# Altium integrated library Cap-Tant-SMD_V2.IntLib: 147 symbols (continued)
## 33uF_20V_TAJY_10%
designator C?  value 33uF  Voltage: 20V  Text1: TAJY  (hidden comment: 33uF_20V_TAJY_10%)
Cap Tantalum Case-Y; Manufacturer: AVX; Part Number: TAJY336K020RNJ; Tol: 10%; Reutech PN: 5910-TN-; Package: TAJ-Y; EDM-PN: *; Text2: *; SAAB PN: *; DCE Part No: *
footprint TAJ-Y (TAJ-Y 7.3x4.3mm)
pins: 1, 2

## 33uF_25V_595D-C_20%
designator C?  value 33uF  Voltage: 25V  Text1: 595D-C  (hidden comment: 33uF_25V_595D-C_20%)
Cap Tantalum Case-C; Manufacturer: Vishay; Part Number: 595D336X0025C2T; Tol: 20%; Reutech PN: 5910-TN-; Package: T595D-C; EDM-PN: *; Text2: *; SAAB PN: *; DCE Part No: *
footprint T595D-C (Tant Capacitor, 2-Leads, Body 6.0x3.2mm, IPC Medium Density)
pins: 1, 2

## 33uF_25V_595D-C_20%-DNF
designator C?, comment value (33uF)  Voltage: 25V  Text1: 595D-C  (hidden comment: 33uF_25V_595D-C_20%)
Cap Tantalum Case-C - Do not Fit; Manufacturer: Vishay; Part Number: DNF - 595D336X0025C2T; Tol: 20%; Reutech PN: 5910-TN-; Package: T595D-C; EDM-PN: *; Text2: *; SAAB PN: *; DCE Part No: *
footprint T595D-C (Tant Capacitor, 2-Leads, Body 6.0x3.2mm, IPC Medium Density)
pins: 1, 2

## 33uF_25V_CASE-D_20%
designator C?, comment value 33uF  Voltage: 25V  Text1: CASE-D  (hidden comment: 33uF_25V_T491D_20%)
Cap Tantalum Case-D; Manufacturer: Various; Tol: 20%; Reutech PN: 5910-TN-; Part Number: 33uF_25V_T491D_20%; Package: T491-D; EDM-PN: *; Text2: *; SAAB PN: *; DCE Part No: *
footprint T491-D (Tant Capacitor, 2-Leads, Body 7.3x4.3mm, IPC Medium Density)
pins: 1, 2

## 33uF_25V_T491-C_10%
designator C?  value 33uF  Voltage: 25V  Text1: T491-C  (hidden comment: 33uF_25V_T491-C_10%)
Cap Tantalum Case-C; Manufacturer: Kemet; Part Number: T491C336K025AT; Tol: 10%; Reutech PN: 5910-TN-; Package: T491-C; EDM-PN: *; Text2: *; SAAB PN: *; DCE Part No: *
footprint T491-C (Tant Capacitor, 2-Leads, Body 6.0x3.2mm, IPC Medium Density)
pins: 1, 2

## 33uF_25V_TAJY_10%
designator C?  value 33uF  Voltage: 25V  Text1: TAJY  (hidden comment: 33uF_25V_TAJY_10%)
Cap Tantalum Case-Y; Manufacturer: AVX; Part Number: TAJY336K025RNJ; Tol: 10%; Reutech PN: 5910-TN-; Package: TAJ-Y; EDM-PN: *; Text2: *; SAAB PN: *; DCE Part No: *
footprint TAJ-Y (TAJ-Y 7.3x4.3mm)
pins: 1, 2

## 33uF_25V_WCAP-PHGP_20%-875015519004
designator C?, comment value 33uF  Voltage: 25V  Text1: PHGP  (hidden comment: 875015519004)
Cap Aluminum Polymer; Manufacturer: Wurth; Tol: 20%; Reutech PN: 5910-TN-; Part Number: 875015519004; Package: WCAP-PHGP-7.3x4.3-1.9; EDM-PN: *; Text2: *; SAAB PN: *; DCE Part No: *
footprint WCAP-PHGP-7.3x4.3-1.9 (Aluminum Polymer 7.3x4.3mm)
pins: 1, 2

## 33uF_35V_CASE-D_10%
designator C?, comment value 33uF  Voltage: 35V  Text1: CASE-D  (hidden comment: 33uF_35V_T491D_10%)
Cap Tantalum Case-D; Manufacturer: Various; Tol: 10%; Reutech PN: 5910-TN-; Part Number: 33uF_35V_T491D_10%; Package: T491-D; EDM-PN: *; Text2: *; SAAB PN: *; DCE Part No: *
footprint T491-D (Tant Capacitor, 2-Leads, Body 7.3x4.3mm, IPC Medium Density)
pins: 1, 2

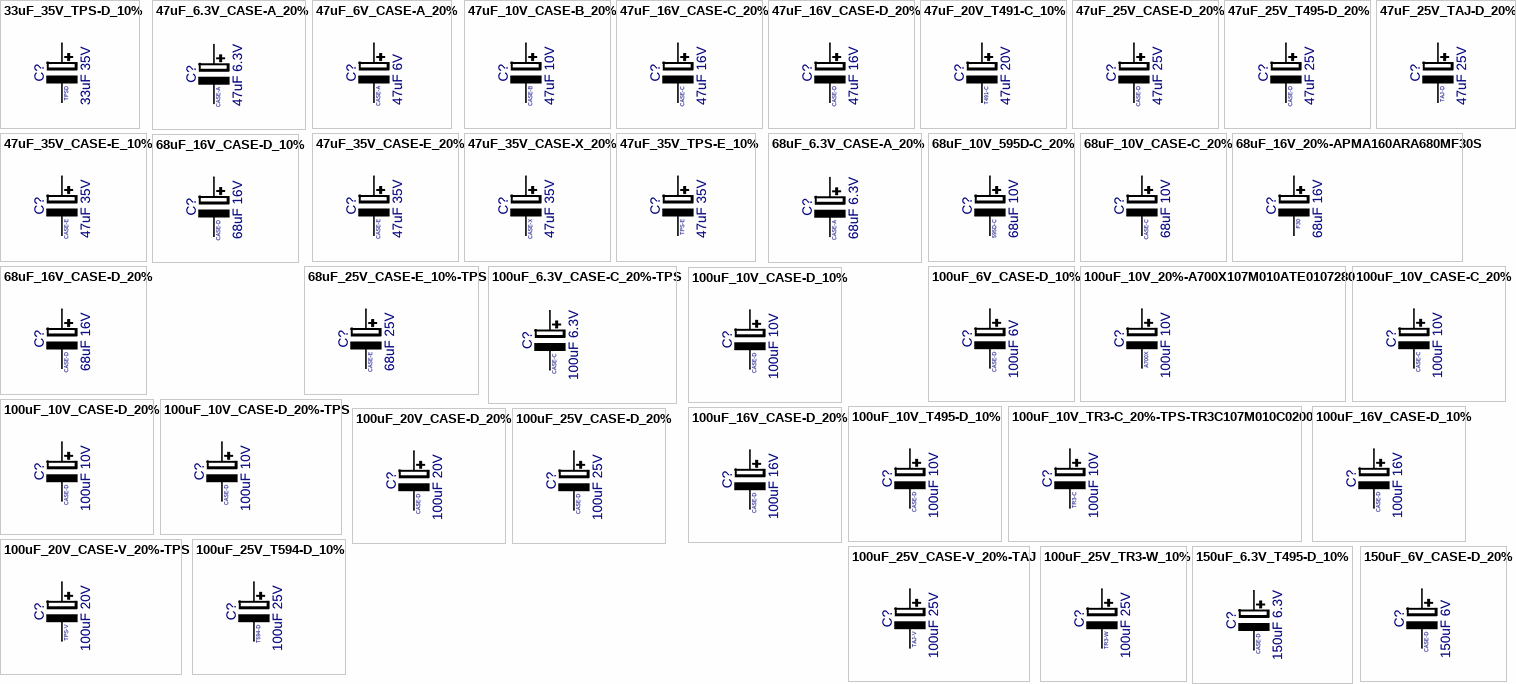
[diagram p2: symbols 33uF_35V_TPS-D_10% to 150uF_6V_CASE-D_20%]

## 33uF_35V_TPS-D_10%
designator C?, comment value 33uF  Voltage: 35V  Text1: TPSD  (hidden comment: 33uF_35V_TPSD_10%)
Cap Tantalum Case-D Low ESR; Manufacturer: AVX; Part Number: TPSD336K035R0300; Tol: 10%; Reutech PN: 5910-TN-; Package: TPS-D; EDM-PN: *; Text2: *; SAAB PN: *; DCE Part No: *
footprint T491-D (Tant Capacitor, 2-Leads, Body 7.3x4.3mm, IPC Medium Density)
pins: 1, 2

## 47uF_6.3V_CASE-A_20%
designator C?, comment value 47uF  Voltage: 6.3V  Text1: CASE-A  (hidden comment: 47uF_6.3V_T491A_20%)
Cap Tantalum Case-A; Manufacturer: Various; Tol: 20%; Reutech PN: 5910-TN-; Part Number: 47uF_6.3V_T491A_20%; Package: T491-A; EDM-PN: *; Text2: *; SAAB PN: *; DCE Part No: *
footprint T491-A (Tant Capacitor, 2-Leads, Body 3.2x1.6mm, IPC Medium Density)
pins: 1, 2

## 47uF_6V_CASE-A_20%
designator C?, comment value 47uF  Voltage: 6V  Text1: CASE-A  (hidden comment: 47uF_6V_T491A_20%)
Cap Tantalum Case-A; Manufacturer: Various; Tol: 20%; Reutech PN: 5910-TN-; Part Number: 47uF_6V_T491A_20%; Package: T491-A; EDM-PN: *; Text2: *; SAAB PN: *; DCE Part No: *
footprint T491-A (Tant Capacitor, 2-Leads, Body 3.2x1.6mm, IPC Medium Density)
pins: 1, 2

## 47uF_10V_CASE-B_20%
designator C?, comment value 47uF  Voltage: 10V  Text1: CASE-B  (hidden comment: 47uF_10V_T491B_20%)
Cap Tantalum Case-B; Manufacturer: Various; Tol: 20%; Reutech PN: 5910-TN-; Part Number: 47uF_10V_T491B_20%; Package: T491-B; EDM-PN: *; Text2: *; SAAB PN: *; DCE Part No: *
footprint T491-B (Tant Capacitor, 2-Leads, Body 3.5x2.8mm, IPC Medium Density)
pins: 1, 2

## 47uF_16V_CASE-C_20%
designator C?, comment value 47uF  Voltage: 16V  Text1: CASE-C  (hidden comment: 47uF_16V_T491C_20%)
Cap Tantalum Case-C; Manufacturer: Various; DCE Part No: 10305; Tol: 20%; Reutech PN: 5910-TN-*; Part Number: 47uF_16V_T491C_20%; Package: T491-C; EDM-PN: *; Text2: *; SAAB PN: *
footprint T491-C (Tant Capacitor, 2-Leads, Body 6.0x3.2mm, IPC Medium Density)
pins: 1, 2

## 47uF_16V_CASE-D_20%
designator C?, comment value 47uF  Voltage: 16V  Text1: CASE-D  (hidden comment: 47uF_16V_T491D_20%)
Cap Tantalum Case-D; Manufacturer: Various; Tol: 20%; Reutech PN: 5910-TN-; Part Number: 47uF_16V_T491D_20%; Package: T491-D; EDM-PN: *; Text2: *; SAAB PN: *; DCE Part No: *
footprint T491-D (Tant Capacitor, 2-Leads, Body 7.3x4.3mm, IPC Medium Density)
pins: 1, 2

## 47uF_20V_T491-C_10%
designator C?  value 47uF  Voltage: 20V  Text1: T491-C  (hidden comment: 47uF_20V_T491-C_10%)
Cap Tantalum Case-C; Manufacturer: Kemet; Part Number: T491C476K020AT; Tol: 10%; Reutech PN: 5910-TN-; Package: T491-C; EDM-PN: *; Text2: *; SAAB PN: *; DCE Part No: *
footprint T491-C (Tant Capacitor, 2-Leads, Body 6.0x3.2mm, IPC Medium Density)
pins: 1, 2

## 47uF_25V_CASE-D_20%
designator C?, comment value 47uF  Voltage: 25V  Text1: CASE-D  (hidden comment: 47uF_25V_T491D_20%)
Cap Tantalum Case-D; Manufacturer: Various; Tol: 20%; Reutech PN: 5910-TN-; Part Number: 47uF_25V_T491D_20%; Package: T491-D; EDM-PN: *; Text2: *; SAAB PN: *; DCE Part No: *
footprint T491-D (Tant Capacitor, 2-Leads, Body 7.3x4.3mm, IPC Medium Density)
pins: 1, 2

## 47uF_25V_T495-D_20%
designator C?  value 47uF  Voltage: 25V  Text1: CASE-D  (hidden comment: 47uF_25V_T495-D_20%)
Cap Tantalum T495 Low ESR; Manufacturer: Kemet; Part Number: T495D476M025ATE200; Tol: 20%; Reutech PN: 5910-TN-; Package: T491-D; EDM-PN: *; Text2: *; SAAB PN: *; DCE Part No: *
footprint T491-D (Tant Capacitor, 2-Leads, Body 7.3x4.3mm, IPC Medium Density)
pins: 1, 2

## 47uF_25V_TAJ-D_20%
designator C?, comment value 47uF  Voltage: 25V  Text1: TAJ-D  (hidden comment: 47uF_25V_TAJD_20%)
Cap Tantalum TAJ-D; Manufacturer: AVX; Tol: 20%; Reutech PN: 5910-TN-; Part Number: 47uF_25V_TAJD_20%; Package: T491-D; EDM-PN: *; Text2: *; SAAB PN: *; DCE Part No: *
footprint T491-D (Tant Capacitor, 2-Leads, Body 7.3x4.3mm, IPC Medium Density)
pins: 1, 2

## 47uF_35V_CASE-E_10%
designator C?, comment value 47uF  Voltage: 35V  Text1: CASE-E  (hidden comment: 47uF_35V_T491E_10%)
Cap Tantalum Case-E; Manufacturer: Various; Tol: 10%; Reutech PN: 5910-TN-; Part Number: 47uF_35V_T491E_10%; Package: T491-E; EDM-PN: *; Text2: *; SAAB PN: *; DCE Part No: *
footprint T491-E (Tant Capacitor, 2-Leads, Body 7.3x6.0mm, IPC Medium Density)
pins: 1, 2

## 47uF_35V_CASE-E_20%
designator C?, comment value 47uF  Voltage: 35V  Text1: CASE-E  (hidden comment: 47uF_35V_T491E_20%)
Cap Tantalum Case-E; Manufacturer: Various; Tol: 20%; Reutech PN: 5910-TN-; Part Number: 47uF_35V_T491E_20%; Package: T491-E; EDM-PN: *; Text2: *; SAAB PN: *; DCE Part No: *
footprint T491-E (Tant Capacitor, 2-Leads, Body 7.3x6.0mm, IPC Medium Density)
pins: 1, 2

## 47uF_35V_CASE-X_20%
designator C?, comment value 47uF  Voltage: 35V  Text1: CASE-X  (hidden comment: 47uF_35V_T491X_20%)
Cap Tantalum Case-X; Manufacturer: Various; Tol: 20%; Reutech PN: 5910-TN-; Part Number: 47uF_35V_T491X_20%; Package: T491-X; EDM-PN: *; Text2: *; SAAB PN: *; DCE Part No: *
footprint T491-X (Tant Capacitor, 2-Leads, Body 7.3x4.3mm, IPC Medium Density)
pins: 1, 2

## 47uF_35V_TPS-E_10%
designator C?  value 47uF  Voltage: 35V  Text1: TPS-E  (hidden comment: 47uF_35V_TPS-E_10%)
Cap Tantalum Case-E; Manufacturer: AVX; Part Number: TPSE476K035R0200; Tol: 10%; Reutech PN: 5910-TN-; Package: TPS-E; EDM-PN: *; Text2: *; SAAB PN: *; DCE Part No: *
footprint TPS-E (Tant Capacitor, 2-Leads, Body 7.3x4.3mm, IPC Medium Density)
pins: 1, 2

## 68uF_6.3V_CASE-A_20%
designator C?, comment value 68uF  Voltage: 6.3V  Text1: CASE-A  (hidden comment: 68uF_6.3V_T491A_20%)
Cap Tantalum Case-A; Manufacturer: Various; Tol: 20%; Reutech PN: 5910-TN-; Part Number: 68uF_6.3V_T491A_20%; Package: T491-A; EDM-PN: *; Text2: *; SAAB PN: *; DCE Part No: *
footprint T491-A (Tant Capacitor, 2-Leads, Body 3.2x1.6mm, IPC Medium Density)
pins: 1, 2

## 68uF_10V_595D-C_20%
designator C?  value 68uF  Voltage: 10V  Text1: 595D-C  (hidden comment: 68uF_10V_595D-C_20%)
Cap Tantalum Case-C; Manufacturer: Vishay; Part Number: 595D686X0010C2T; Tol: 20%; Reutech PN: 5910-TN-; Package: T595D-C; EDM-PN: *; Text2: *; SAAB PN: *; DCE Part No: *
footprint T595D-C (Tant Capacitor, 2-Leads, Body 6.0x3.2mm, IPC Medium Density)
pins: 1, 2

## 68uF_10V_CASE-C_20%
designator C?, comment value 68uF  Voltage: 10V  Text1: CASE-C  (hidden comment: 68uF_10V_T491C_20%)
Cap Tantalum Case-C; Manufacturer: Various; Tol: 20%; Reutech PN: 5910-TN-; Part Number: 68uF_10V_T491C_20%; Package: T491-C; EDM-PN: *; Text2: *; SAAB PN: *; DCE Part No: *
footprint T491-C (Tant Capacitor, 2-Leads, Body 6.0x3.2mm, IPC Medium Density)
pins: 1, 2

## 68uF_16V_20%-APMA160ARA680MF30S
designator C?, comment value 68uF  Voltage: 16V  Text1: F30  (hidden comment: APMA160ARA680MF30S)
Cap Aluminum Polymer; Manufacturer: United Chemi-Con; Tol: 20%; Reutech PN: 5910-TN-; Part Number: APMA160ARA680MF30S; Package: CAP-EL-SMD-MPS-F30; EDM-PN: *; Text2: *; SAAB PN: *; DCE Part No: *
footprint CAP-EL-SMD-MPS-F30 (CAP El SMD 6.3x7.7mm)
pins: 1, 2

## 68uF_16V_CASE-D_10%
designator C?, comment value 68uF  Voltage: 16V  Text1: CASE-D  (hidden comment: 68uF_16V_T491D_10%)
Cap Tantalum Case-D; Manufacturer: Various; Tol: 10%; Reutech PN: 5910-TN-; Part Number: 68uF_16V_T491D_10%; Package: T491-D; EDM-PN: *; Text2: *; SAAB PN: *; DCE Part No: *
footprint T491-D (Tant Capacitor, 2-Leads, Body 7.3x4.3mm, IPC Medium Density)
pins: 1, 2

## 68uF_16V_CASE-D_20%
designator C?, comment value 68uF  Voltage: 16V  Text1: CASE-D  (hidden comment: 68uF_16V_T491D_20%)
Cap Tantalum Case-D; Manufacturer: Various; Tol: 20%; Reutech PN: 5910-TN-; Part Number: 68uF_16V_T491D_20%; Package: T491-D; EDM-PN: *; Text2: *; SAAB PN: *; DCE Part No: *
footprint T491-D (Tant Capacitor, 2-Leads, Body 7.3x4.3mm, IPC Medium Density)
pins: 1, 2

## 68uF_25V_CASE-E_10%-TPS
designator C?  value 68uF  Voltage: 25V  Text1: CASE-E  (hidden comment: 68uF_25V_CASE-E_10%-TPS)
Cap Tantalum TPS Low ESR; Manufacturer: AVX; Part Number: TPSE686K025R0125; Tol: 10%; Reutech PN: 5910-TN-; Package: T491-E; EDM-PN: *; Text2: *; SAAB PN: *; DCE Part No: *
footprint T491-E (Tant Capacitor, 2-Leads, Body 7.3x6.0mm, IPC Medium Density)
pins: 1, 2

## 100uF_6.3V_CASE-C_20%-TPS
designator C?  value 100uF  Voltage: 6.3V  Text1: CASE-C  (hidden comment: 100uF_6.3V_CASE-C_20%-TPS)
Cap Tantalum TPS Low ESR; Manufacturer: AVX; Part Number: TPSC107M006#0075; Tol: 20%; Reutech PN: 5910-TN-; Package: T491-C; EDM-PN: *; Text2: *; SAAB PN: *; DCE Part No: *
footprint T491-C (Tant Capacitor, 2-Leads, Body 6.0x3.2mm, IPC Medium Density)
pins: 1, 2

## 100uF_6V_CASE-D_10%
designator C?  value 100uF  Voltage: 6V  Text1: CASE-D  (hidden comment: 100uF_6V_CASE-D_10%)
Cap Tantalum Case-D; Manufacturer: Various; Part Number: 100uF_6V_T491D_10%; Tol: 10%; Reutech PN: 5910-TN-; Package: T491-D; EDM-PN: *; Text2: *; SAAB PN: *; DCE Part No: *
footprint T491-D (Tant Capacitor, 2-Leads, Body 7.3x4.3mm, IPC Medium Density)
pins: 1, 2

## 100uF_10V_20%-A700X107M010ATE0107280
designator C?, comment value 100uF  Voltage: 10V  Text1: A700X  (hidden comment: A700X107M010ATE0107280)
Cap Aluminium Organic Polymer A700X Low ESR; Manufacturer: Kemet; Tol: 20%; Part Number: A700X107M010ATE0107280; Package: TANT-A700X; EDM-PN: *; Text2: *; Reutech PN: *; SAAB PN: *; DCE Part No: *
footprint TANT-A700X (A700X 7.3x4.3mm)
pins: 1, 2

## 100uF_10V_CASE-C_20%
designator C?, comment value 100uF  Voltage: 10V  Text1: CASE-C  (hidden comment: 100uF_10V_T491C_20%)
Cap Tantalum Case-C; Manufacturer: Various; Tol: 20%; Reutech PN: 5910-TN-; Part Number: 100uF_10V_T491C_20%; Package: T491-C; EDM-PN: *; Text2: *; SAAB PN: *; DCE Part No: *
footprint T491-C (Tant Capacitor, 2-Leads, Body 6.0x3.2mm, IPC Medium Density)
pins: 1, 2

## 100uF_10V_CASE-D_10%
designator C?  value 100uF  Voltage: 10V  Text1: CASE-D  (hidden comment: 100uF_10V_CASE-D_10%)
Cap Tantalum Case-D; Manufacturer: Various; Part Number: 100uF_10V_T491D_10%; Tol: 10%; Reutech PN: 5910-TN-0078; Package: T491-D; EDM-PN: *; Text2: *; SAAB PN: *; DCE Part No: *
footprint T491-D (Tant Capacitor, 2-Leads, Body 7.3x4.3mm, IPC Medium Density)
pins: 1, 2

## 100uF_10V_CASE-D_20%
designator C?  value 100uF  Voltage: 10V  Text1: CASE-D  (hidden comment: 100uF_10V_CASE-D_20%)
Cap Tantalum Case-D; Manufacturer: Various; Part Number: 100uF_10V_T491D_20%; Tol: 20%; Reutech PN: 5910-TN-; Package: T491-D; EDM-PN: *; Text2: *; SAAB PN: *; DCE Part No: *
footprint T491-D (Tant Capacitor, 2-Leads, Body 7.3x4.3mm, IPC Medium Density)
pins: 1, 2

## 100uF_10V_CASE-D_20%-TPS
designator C?  value 100uF  Voltage: 10V  Text1: CASE-D  (hidden comment: 100uF_10V_CASE-D_20%-TPS)
Cap Tantalum TPS Low ESR; Manufacturer: AVX; Part Number: TPSD107M010#0050; Tol: 20%; Reutech PN: 5910-TN-; Package: T491-D; EDM-PN: *; Text2: *; SAAB PN: *; DCE Part No: *
footprint T491-D (Tant Capacitor, 2-Leads, Body 7.3x4.3mm, IPC Medium Density)
pins: 1, 2

## 100uF_10V_T495-D_10%
designator C?  value 100uF  Voltage: 10V  Text1: CASE-D  (hidden comment: 100uF_10V_T495-D_10%)
Cap Tantalum T495 Low ESR; Manufacturer: Kemet; Part Number: T495D107K010ATE100; Tol: 10%; Reutech PN: 5910-TN-0192; Package: T491-D; EDM-PN: *; Text2: *; SAAB PN: *; DCE Part No: *
footprint T491-D (Tant Capacitor, 2-Leads, Body 7.3x4.3mm, IPC Medium Density)
pins: 1, 2

## 100uF_10V_TR3-C_20%-TPS-TR3C107M010C0200
designator C?, comment value 100uF  Voltage: 10V  Text1: TR3-C  (hidden comment: TR3C107M010C0200)
Cap Tantalum TP3 Low ESR; Manufacturer: Vishay; Tol: 20%; Part Number: TR3C107M010C0200; Package: TR3-C; EDM-PN: *; Text2: *; Reutech PN: *; SAAB PN: *; DCE Part No: *
footprint TR3-C (Tant Capacitor, 2-Leads, Body 6.0x3.2mm, IPC Medium Density)
pins: 1, 2

## 100uF_16V_CASE-D_10%
designator C?  value 100uF  Voltage: 16V  Text1: CASE-D  (hidden comment: 100uF_16V_CASE-D_10%)
Cap Tantalum Case-D; Manufacturer: Various; Part Number: 100uF_16V_T491D_10%; Tol: 10%; Reutech PN: 5910-TN-0195; Package: T491-D; EDM-PN: *; Text2: *; SAAB PN: *; DCE Part No: *
footprint T491-D (Tant Capacitor, 2-Leads, Body 7.3x4.3mm, IPC Medium Density)
pins: 1, 2

## 100uF_16V_CASE-D_20%
designator C?  value 100uF  Voltage: 16V  Text1: CASE-D  (hidden comment: 100uF_16V_CASE-D_20%)
Cap Tantalum Case-D; Manufacturer: Various; Part Number: 100uF_16V_T491D_20%; Tol: 20%; Reutech PN: 5910-TN-; Package: T491-D; EDM-PN: *; Text2: *; SAAB PN: *; DCE Part No: *
footprint T491-D (Tant Capacitor, 2-Leads, Body 7.3x4.3mm, IPC Medium Density)
pins: 1, 2

## 100uF_20V_CASE-D_20%
designator C?  value 100uF  Voltage: 20V  Text1: CASE-D  (hidden comment: 100uF_20V_CASE-D_20%)
Cap Tantalum Case-D; Manufacturer: Various; Part Number: 100uF_20V_T491D_20%; Tol: 20%; Reutech PN: 5910-TN-; Package: T491-D; EDM-PN: *; Text2: *; SAAB PN: *; DCE Part No: *
footprint T491-D (Tant Capacitor, 2-Leads, Body 7.3x4.3mm, IPC Medium Density)
pins: 1, 2

## 100uF_20V_CASE-V_20%-TPS
designator C?, comment value 100uF  Voltage: 20V  Text1: TPS-V  (hidden comment: 100uF_20V_CASE-V_20%)
Cap Tantalum Case-V; Manufacturer: AVX; Part Number: TPSV107K020R0060; Tol: 20%; Reutech PN: 5910-TN-; Package: TPS-V; EDM-PN: *; Text2: *; SAAB PN: *; DCE Part No: *
footprint TPS-V (Tant Capacitor, 2-Leads, Body 7.3x6.1mm, IPC Medium Density)
pins: 1, 2

## 100uF_25V_CASE-D_20%
designator C?  value 100uF  Voltage: 25V  Text1: CASE-D  (hidden comment: 100uF_25V_CASE-D_20%)
Cap Tantalum Case-D; Manufacturer: Various; Part Number: 100uF_25V_T491D_20%; Tol: 20%; Reutech PN: 5910-TN-; Package: T491-D; EDM-PN: *; Text2: *; SAAB PN: *; DCE Part No: *
footprint T491-D (Tant Capacitor, 2-Leads, Body 7.3x4.3mm, IPC Medium Density)
pins: 1, 2

## 100uF_25V_CASE-V_20%-TAJ
designator C?, comment value 100uF  Voltage: 25V  Text1: TAJ-V  (hidden comment: TAJV107K025RNJ)
Cap Tantalum Case-V; Manufacturer: AVX; Tol: 20%; Reutech PN: 5910-TN-; Part Number: TAJV107K025RNJ; Package: TAJ-V; EDM-PN: *; Text2: *; SAAB PN: *; DCE Part No: *
footprint TAJ-V (TAJ-V 7.3x6.1mm, IPC Medium Density)
pins: 1, 2

## 100uF_25V_T594-D_10%
designator C?  value 100uF  Voltage: 25V  Text1: T594-D  (hidden comment: 100uF_25V_T594-D_10%)
Cap Tantalum T594 Low ESR; Manufacturer: Kemet; Part Number: 594D107X9025R2T; Tol: 10%; Reutech PN: 5910-TN-; Package: T594-D; EDM-PN: *; Text2: *; SAAB PN: *; DCE Part No: *
footprint T594-D (Tant Capacitor, 2-Leads, Body 7.3x4.3mm, IPC Medium Density)
pins: 1, 2

## 100uF_25V_TR3-W_10%
designator C?  value 100uF  Voltage: 25V  Text1: TR3-W  (hidden comment: 100uF_25V_TR3-W_10%)
Cap Tantalum Case-W Low ESR; Manufacturer: Vishay; Part Number: TR3A336K6R3C0600; Tol: 10%; Reutech PN: 5910-TN-; Package: TR3-W; EDM-PN: *; Text2: *; SAAB PN: *; DCE Part No: *
footprint TR3-W (TR3 W 2-Leads, Body 3.2x1.6mm)
pins: 1, 2

## 150uF_6.3V_T495-D_10%
designator C?  value 150uF  Voltage: 6.3V  Text1: CASE-D  (hidden comment: 150uF_6.3V_T495-D_10%)
Cap Tantalum T495 Low ESR; Manufacturer: Kemet; Part Number: T495X157K006ATE100; Tol: 10%; Reutech PN: 5910-TN-; Package: T491-D; EDM-PN: *; Text2: *; SAAB PN: *; DCE Part No: *
footprint T491-D (Tant Capacitor, 2-Leads, Body 7.3x4.3mm, IPC Medium Density)
pins: 1, 2

## 150uF_6V_CASE-D_20%
designator C?  value 150uF  Voltage: 6V  Text1: CASE-D  (hidden comment: 150uF_6V_CASE-D_20%)
Cap Tantalum Case-D; Manufacturer: Various; Part Number: 150uF_6V_T491D_20%; Tol: 20%; Reutech PN: 5910-TN-; Package: T491-D; EDM-PN: *; Text2: *; SAAB PN: *; DCE Part No: *
footprint T491-D (Tant Capacitor, 2-Leads, Body 7.3x4.3mm, IPC Medium Density)
pins: 1, 2

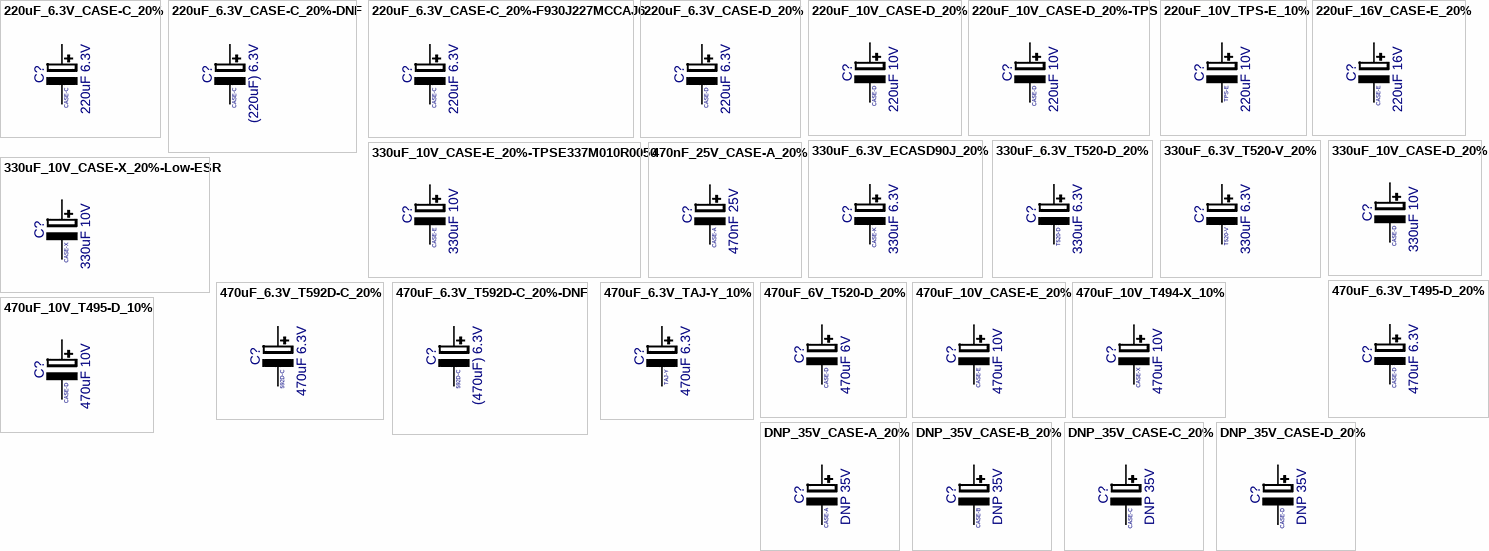
[diagram p3: symbols 220uF_6.3V_CASE-C_20% to DNP_35V_CASE-D_20%]

## 220uF_6.3V_CASE-C_20%
designator C?, comment value 220uF  Voltage: 6.3V  Text1: CASE-C  (hidden comment: 220uF_6.3V_T491C_20%)
Cap Tantalum Case-C; Manufacturer: Various; EDM-PN: CAP1309; Tol: 20%; Part Number: 220uF_6.3V_T491C_20%; Package: T491-C; Text2: *; Reutech PN: *; SAAB PN: *; DCE Part No: *
footprint T491-C (Tant Capacitor, 2-Leads, Body 6.0x3.2mm, IPC Medium Density)
pins: 1, 2

## 220uF_6.3V_CASE-C_20%-DNF
designator C?, comment value (220uF)  Voltage: 6.3V  Text1: CASE-C  (hidden comment: 220uF_6.3V_T491C_20%)
Cap Tantalum Case-C - Do not Fit; Manufacturer: Various; Part Number: DNF - 220uF_6.3V_T491C_20%; Tol: 20%; Reutech PN: 5910-TN-; Package: T491-C; EDM-PN: *; Text2: *; SAAB PN: *; DCE Part No: *
footprint T491-C (Tant Capacitor, 2-Leads, Body 6.0x3.2mm, IPC Medium Density)
pins: 1, 2

## 220uF_6.3V_CASE-C_20%-F930J227MCCAJ6
designator C?, comment value 220uF  Voltage: 6.3V  Text1: CASE-C  (hidden comment: F930J227MCCAJ6)
Cap Tantalum Case-C; Manufacturer: AVX; EDM-PN: CAP1309; Tol: 20%; Part Number: F930J227MCCAJ6; Package: T491-C; Text2: *; Reutech PN: *; SAAB PN: *; DCE Part No: *
footprint T491-C (Tant Capacitor, 2-Leads, Body 6.0x3.2mm, IPC Medium Density)
pins: 1, 2

## 220uF_6.3V_CASE-D_20%
designator C?  value 220uF  Voltage: 6.3V  Text1: CASE-D  (hidden comment: 220uF_6.3V_CASE-D_20%)
Cap Tantalum Case-D; Manufacturer: Various; Part Number: 220uF_6.3V_T491D_20%; Tol: 20%; Reutech PN: 5910-TN-; Package: T491-D; EDM-PN: *; Text2: *; SAAB PN: *; DCE Part No: *
footprint T491-D (Tant Capacitor, 2-Leads, Body 7.3x4.3mm, IPC Medium Density)
pins: 1, 2

## 220uF_10V_CASE-D_20%
designator C?  value 220uF  Voltage: 10V  Text1: CASE-D  (hidden comment: 220uF_10V_CASE-D_20%)
Cap Tantalum Case-D; Manufacturer: Various; Part Number: 220uF_10V_T491D_20%; Tol: 20%; Reutech PN: 5910-TN-; Package: T491-D; EDM-PN: *; Text2: *; SAAB PN: *; DCE Part No: *
footprint T491-D (Tant Capacitor, 2-Leads, Body 7.3x4.3mm, IPC Medium Density)
pins: 1, 2

## 220uF_10V_CASE-D_20%-TPS
designator C?, comment value 220uF  Voltage: 10V  Text1: CASE-D  (hidden comment: 220uF_10V_CASE-D_20%)
Cap Tantalum TPS Low ESR; Manufacturer: Various; Part Number: 220uF_10V_T491D_20% Low ESR; Tol: 20%; Reutech PN: 5910-TN-; Package: T491-D; EDM-PN: *; Text2: *; SAAB PN: *; DCE Part No: *
footprint T491-D (Tant Capacitor, 2-Leads, Body 7.3x4.3mm, IPC Medium Density)
pins: 1, 2

## 220uF_10V_TPS-E_10%
designator C?  value 220uF  Voltage: 10V  Text1: TPS-E  (hidden comment: 220uF_10V_TPS-E_10%)
Cap Tantalum Case-E; Manufacturer: AVX; Part Number: TPSE227K010R0100; Tol: 10%; Reutech PN: 5910-TN-; Package: TPS-E; EDM-PN: *; Text2: *; SAAB PN: *; DCE Part No: *
footprint TPS-E (Tant Capacitor, 2-Leads, Body 7.3x4.3mm, IPC Medium Density)
pins: 1, 2

## 220uF_16V_CASE-E_20%
designator C?, comment value 220uF  Voltage: 16V  Text1: CASE-E  (hidden comment: 220uF_16V_T491E_20%)
Cap Tantalum Case-E; Manufacturer: Various; Tol: 20%; Reutech PN: 5910-TN-; Part Number: 220uF_16V_T491E_20%; Package: T491-E; EDM-PN: *; Text2: *; SAAB PN: *; DCE Part No: *
footprint T491-E (Tant Capacitor, 2-Leads, Body 7.3x6.0mm, IPC Medium Density)
pins: 1, 2

## 330uF_6.3V_ECASD90J_20%
designator C?  value 330uF  Voltage: 6.3V  Text1: CASE-K  (hidden comment: 330uF_6.3V_ECASD90J_20%)
Cap Tantalum ECASD90J; Manufacturer: Murata; Part Number: T520V337M006ATE018; Tol: 20%; Reutech PN: 5910-TN-; Package: TANT-CASE-K; EDM-PN: *; Text2: *; SAAB PN: *; DCE Part No: *
footprint TANT-CASE-K (Tant Capacitor, 2-Leads, Body 7.3x4.3mm, IPC Medium Density)
pins: 1, 2

## 330uF_6.3V_T520-D_20%
designator C?, comment value 330uF  Voltage: 6.3V  Text1: T520-D  (hidden comment: T520D337M006ATE)
Cap Tantalum T520-D; Manufacturer: Kemet; EDM-PN: CAP1433; Tol: 20%; Part Number: T520D337M006ATE; Package: T520-D; Text2: *; Reutech PN: *; SAAB PN: *; DCE Part No: *
footprint T520-D (Tant Capacitor, 2-Leads, Body 7.3x4.3mm, IPC Medium Density)
pins: 1, 2

## 330uF_6.3V_T520-V_20%
designator C?  value 330uF  Voltage: 6.3V  Text1: T520-V  (hidden comment: 330uF_6.3V_T520-V_20%)
Cap Tantalum T520-V; Manufacturer: Kemet; Part Number: T520V337M006ATE018; Tol: 20%; Reutech PN: 5910-TN-; Package: T520-V; EDM-PN: *; Text2: *; SAAB PN: *; DCE Part No: *
footprint T491-D (Tant Capacitor, 2-Leads, Body 7.3x4.3mm, IPC Medium Density)
pins: 1, 2

## 330uF_10V_CASE-D_20%
designator C?  value 330uF  Voltage: 10V  Text1: CASE-D  (hidden comment: 330uF_10V_CASE-D_20%)
Cap Tantalum Case-D; Manufacturer: Various; Part Number: 330uF_10V_T491D_20%; Tol: 20%; Reutech PN: 5910-TN-; Package: T491-D; EDM-PN: *; Text2: *; SAAB PN: *; DCE Part No: *
footprint T491-D (Tant Capacitor, 2-Leads, Body 7.3x4.3mm, IPC Medium Density)
pins: 1, 2

## 330uF_10V_CASE-E_20%-TPSE337M010R0050
designator C?, comment value 330uF  Voltage: 10V  Text1: CASE-E  (hidden comment: TPSE337M010R0050)
Cap Tantalum TPS Low ESR; Manufacturer: AVX; DCE Part No: 10306; Tol: 20%; Part Number: TPSE337M010R0050; Package: TPS-E; EDM-PN: *; Text2: *; Reutech PN: *; SAAB PN: *
footprint TPS-E (Tant Capacitor, 2-Leads, Body 7.3x4.3mm, IPC Medium Density)
pins: 1, 2

## 330uF_10V_CASE-X_20%-Low-ESR
designator C?, comment value 330uF  Voltage: 10V  Text1: CASE-X  (hidden comment: 330uF_10V_CASE-X_20%)
Cap Tantalum Low ESR; Manufacturer: Various; Part Number: 330uF_10V_T491X_20% Low ESR; Tol: 20%; Reutech PN: 5910-TN-; Package: T491-X; EDM-PN: *; Text2: *; SAAB PN: *; DCE Part No: *
footprint T491-X (Tant Capacitor, 2-Leads, Body 7.3x4.3mm, IPC Medium Density)
pins: 1, 2

## 470nF_25V_CASE-A_20%
designator C?, comment value 470nF  Voltage: 25V  Text1: CASE-A  (hidden comment: 470nF_25V_T491A_20%)
Cap Tantalum Case-A; Manufacturer: Various; Tol: 20%; Reutech PN: 5910-TN-; Part Number: 470nF_25V_T491A_20%; Package: T491-A; EDM-PN: *; Text2: *; SAAB PN: *; DCE Part No: *
footprint T491-A (Tant Capacitor, 2-Leads, Body 3.2x1.6mm, IPC Medium Density)
pins: 1, 2

## 470uF_6.3V_T495-D_20%
designator C?  value 470uF  Voltage: 6.3V  Text1: CASE-D  (hidden comment: 470uF_6.3V_T495-D_20%)
Cap Tantalum T495 Surge Robust Low ESR MnO2; Manufacturer: Kemet; Part Number: T495D477M006ATE045; Tol: 20%; Reutech PN: 5910-TN-; Package: T491-D; EDM-PN: *; Text2: *; SAAB PN: *; DCE Part No: *
footprint T491-D (Tant Capacitor, 2-Leads, Body 7.3x4.3mm, IPC Medium Density)
pins: 1, 2

## 470uF_6.3V_T592D-C_20%
designator C?  value 470uF  Voltage: 6.3V  Text1: 592D-C  (hidden comment: 470uF_6.3V_T592D-C_20%)
Cap Tantalum T592D; Manufacturer: Vishay; Part Number: 592D477X06R3C2T20H; Tol: 20%; Reutech PN: 5910-TN-; Package: T592D-C-2.0; EDM-PN: *; Text2: *; SAAB PN: *; DCE Part No: *
footprint T592D-C-2.0 (592D-C 7.1x3.2 2.0mm)
pins: 1, 2

## 470uF_6.3V_T592D-C_20%-DNF
designator C?, comment value (470uF)  Voltage: 6.3V  Text1: 592D-C  (hidden comment: 470uF_6.3V_T592D-C_20%)
Cap Tantalum T592D - Do not Fit; Manufacturer: Vishay; Part Number: DNF - 592D477X06R3C2T20H; Tol: 20%; Reutech PN: 5910-TN-; Package: T592D-C-2.0; EDM-PN: *; Text2: *; SAAB PN: *; DCE Part No: *
footprint T592D-C-2.0 (592D-C 7.1x3.2 2.0mm)
pins: 1, 2

## 470uF_6.3V_TAJ-Y_10%
designator C?  value 470uF  Voltage: 6.3V  Text1: TAJ-Y  (hidden comment: 470uF_6.3V_TAJ-Y_10%)
Cap Tantalum TAJ Low Profile; Manufacturer: AVX; Part Number: TAJY477K006RNJ; Tol: 10%; Reutech PN: 5910-TN-; Package: TAJ-Y; EDM-PN: *; Text2: *; SAAB PN: *; DCE Part No: *
footprint TAJ-Y (TAJ-Y 7.3x4.3mm)
pins: 1, 2

## 470uF_6V_T520-D_20%
designator C?  value 470uF  Voltage: 6V  Text1: CASE-D  (hidden comment: 470uF_6V_T520-D_20%)
Cap Polymer T520 Low ESR; Manufacturer: Kemet; Part Number: T520D477K006ATE030; Tol: 20%; Reutech PN: 5910-TN-; Package: T491-D; EDM-PN: *; Text2: *; SAAB PN: *; DCE Part No: *
footprint T491-D (Tant Capacitor, 2-Leads, Body 7.3x4.3mm, IPC Medium Density)
pins: 1, 2

## 470uF_10V_CASE-E_20%
designator C?, comment value 470uF  Voltage: 10V  Text1: CASE-E  (hidden comment: 470uF_10V_T491E_20%)
Cap Tantalum Case-E; Manufacturer: Various; Tol: 20%; Reutech PN: 5910-TN-; Part Number: 470uF_10V_T491E_20%; Package: T491-E; EDM-PN: *; Text2: *; SAAB PN: *; DCE Part No: *
footprint T491-E (Tant Capacitor, 2-Leads, Body 7.3x6.0mm, IPC Medium Density)
pins: 1, 2

## 470uF_10V_T494-X_10%
designator C?, comment value 470uF  Voltage: 10V  Text1: CASE-X  (hidden comment: 470uF_10V_T494-X__10%)
Cap Tantalum T494 Low ESR; Manufacturer: Kemet; Part Number: T494X477M6AS; Tol: 10%; Reutech PN: 5910-TN-; Package: T494-X; EDM-PN: *; Text2: *; SAAB PN: *; DCE Part No: *
footprint T491-X (Tant Capacitor, 2-Leads, Body 7.3x4.3mm, IPC Medium Density)
pins: 1, 2

## 470uF_10V_T495-D_10%
designator C?  value 470uF  Voltage: 10V  Text1: CASE-D  (hidden comment: 470uF_10V_T495-D_10%)
Cap Tantalum T495 Low ESR; Manufacturer: Kemet; Part Number: T495D477K010ATE100; Tol: 10%; Reutech PN: 5910-TN-; Package: T491-D; EDM-PN: *; Text2: *; SAAB PN: *; DCE Part No: *
footprint T491-D (Tant Capacitor, 2-Leads, Body 7.3x4.3mm, IPC Medium Density)
pins: 1, 2

## DNP_35V_CASE-A_20%
designator C?, comment value DNP  Voltage: 35V  Text1: CASE-A  (hidden comment: DNP_35V_T491A_20%)
Cap Tantalum Case-A; Manufacturer: Various; Tol: 20%; Reutech PN: 5910-TN-; Part Number: DNP; Package: T491-A; EDM-PN: *; Text2: *; SAAB PN: *; DCE Part No: *
footprint T491-A (Tant Capacitor, 2-Leads, Body 3.2x1.6mm, IPC Medium Density)
pins: 1, 2

## DNP_35V_CASE-B_20%
designator C?, comment value DNP  Voltage: 35V  Text1: CASE-B  (hidden comment: DNP_35V_T491B_20%)
Cap Tantalum Case-B; Manufacturer: Various; Tol: 20%; Reutech PN: 5910-TN-; Part Number: DNP; Package: T491-B; EDM-PN: *; Text2: *; SAAB PN: *; DCE Part No: *
footprint T491-B (Tant Capacitor, 2-Leads, Body 3.5x2.8mm, IPC Medium Density)
pins: 1, 2

## DNP_35V_CASE-C_20%
designator C?, comment value DNP  Voltage: 35V  Text1: CASE-C  (hidden comment: DNP_35V_T491C_20%)
Cap Tantalum Case-C; Manufacturer: Various; Tol: 20%; Reutech PN: 5910-TN-; Part Number: DNP; Package: T491-C; EDM-PN: *; Text2: *; SAAB PN: *; DCE Part No: *
footprint T491-C (Tant Capacitor, 2-Leads, Body 6.0x3.2mm, IPC Medium Density)
pins: 1, 2

## DNP_35V_CASE-D_20%
designator C?, comment value DNP  Voltage: 35V  Text1: CASE-D  (hidden comment: DNP_35V_T491D_20%)
Cap Tantalum Case-D; Manufacturer: Various; Tol: 20%; Reutech PN: 5910-TN-; Part Number: DNP; Package: T491-D; EDM-PN: *; Text2: *; SAAB PN: *; DCE Part No: *
footprint T491-D (Tant Capacitor, 2-Leads, Body 7.3x4.3mm, IPC Medium Density)
pins: 1, 2